# Altium footprint library robo.PcbLib: 14 footprints
Each footprint in its own frame and in the unit in brackets; x right, y up, seen from the top. Pads: shape width x height; smd on the part's side, far side on the other; paste and mask are expansions set on the pad; w line width, h text height; cw(c..) or ccw(c..) is an arc to the next point about the centre after c.
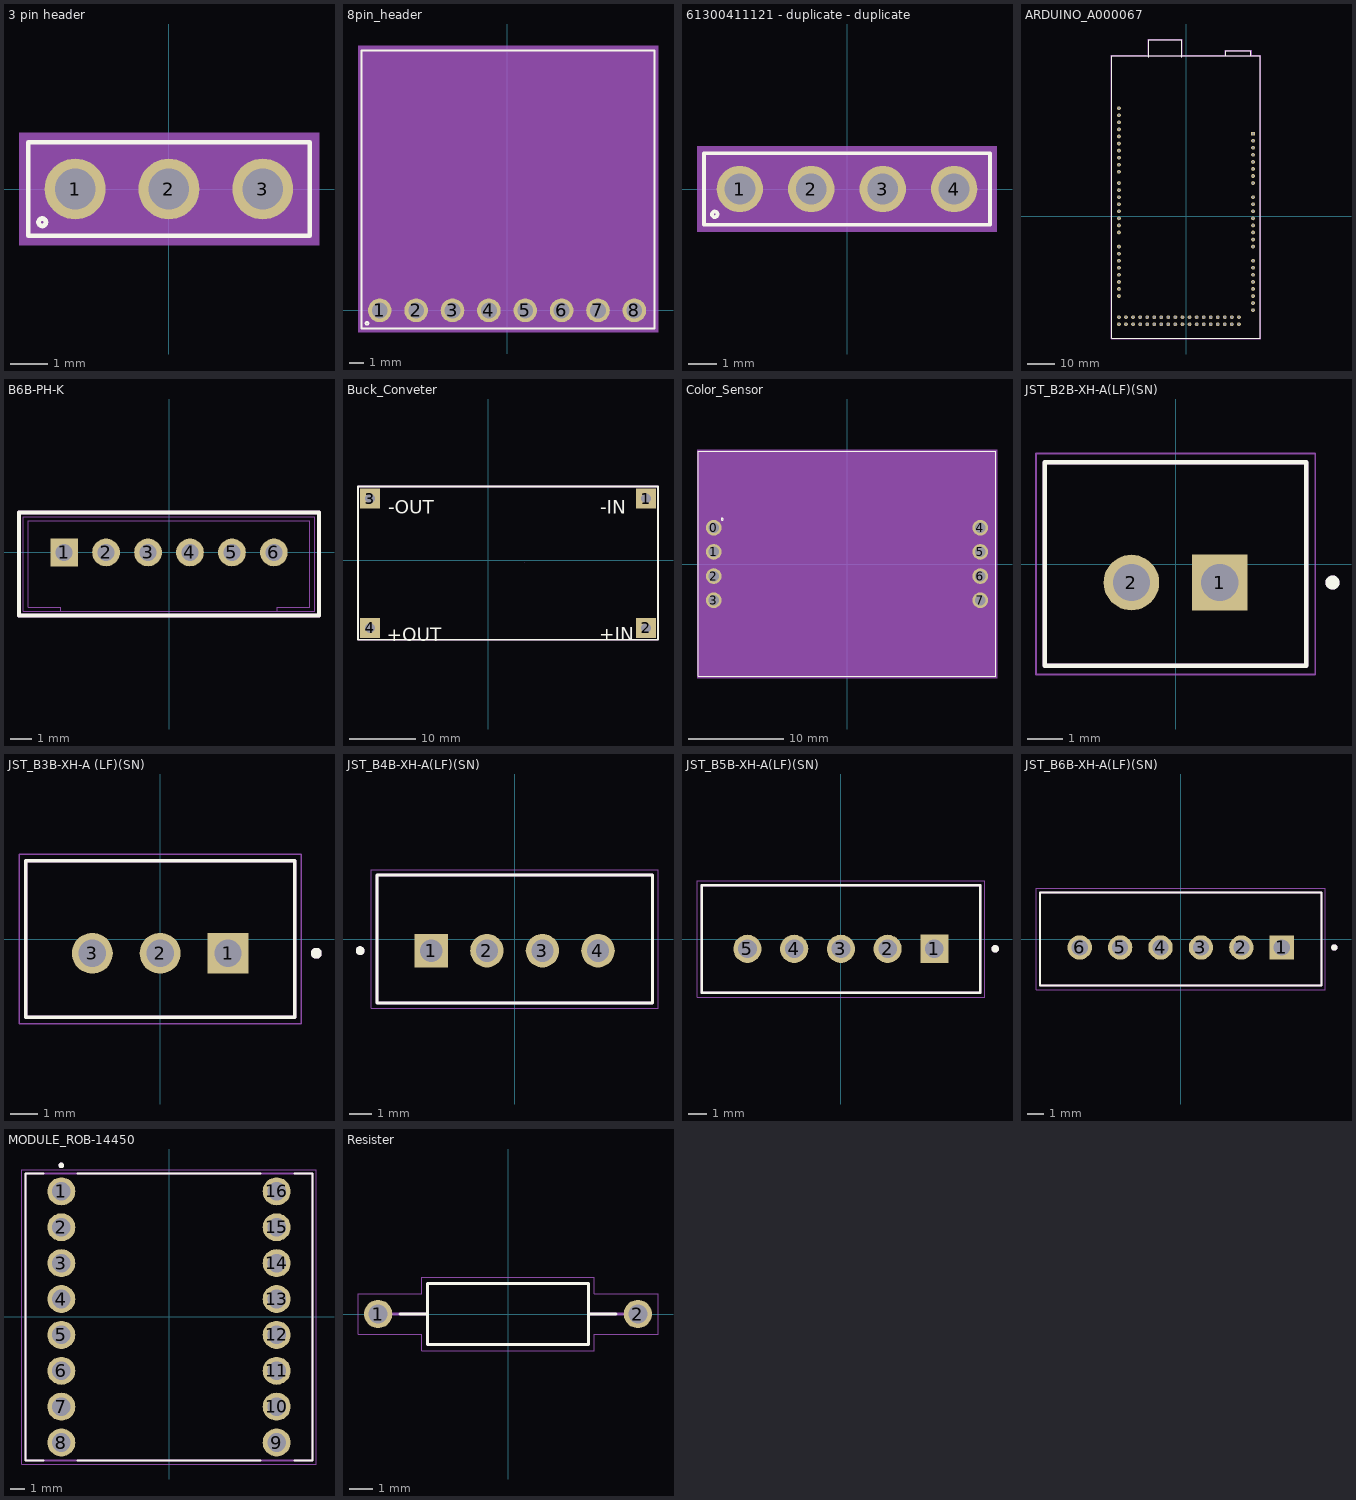
[diagram p0: the footprints below, top view; thin cyan lines are the x and y axes]

## 3 pin header [mm]
pads (3):
  round 1.65 hole 1.1: 1(-2.54,0) 2(0,0) 3(2.54,0)
Top Overlay:
  circle w0.127: c-3.43,-0.9 r0.1
  lines w0.127: -3.81,-1.27 -3.81,1.27 3.81,1.27 3.81,0.635 3.81,-0.635 3.81,-1.27 -3.81,-1.27
Top Assembly:
  circle w0.127: c-3.43,-0.9 r0.1
  lines w0.127: -3.81,-1.27 -3.81,1.27 3.81,1.27 3.81,-1.27 -3.81,-1.27
  text ".Designator" at -6.35,-0.508 h1.52
Mechanical 15:
  region: 4.064,-1.52 -4.06,-1.52 -4.06,1.52 4.064,1.52

## 8pin_header [mm]
pads (8):
  round 1.65 hole 1.1: 1(-8.89,0) 2(-6.35,0) 3(-3.81,0) 4(-1.27,0) 5(1.27,0) 6(3.81,0) 7(6.35,0) 8(8.89,0)
Top Overlay:
  circle w0.127: c-9.78,-0.9 r0.1
  circle w0.127: c-9.78,-0.9 r0.1
  lines w0.127: 10.287,-1.27 10.287,-0.762 ; 10.287,-1.27 10.287,-0.762 ; 10.287,-1.27 10.287,-0.762 ; 10.287,-1.27 0,-1.27 -10.16,-1.27 -10.16,18.161 10.287,18.161 10.287,-0.762
Top Assembly:
  circle w0.127: c-9.78,-0.9 r0.1
  circle w0.127: c-9.78,-0.9 r0.1
  lines w0.127: 10.287,-1.27 10.287,-0.762 ; 10.287,-1.27 10.287,-0.762 ; 10.287,-1.27 10.287,-0.762 ; 10.287,-1.27 0,-1.27 -10.16,-1.27 -10.16,18.161 10.287,18.161 10.287,-0.762
  text ".Designator" at -8.382,6.731 h1.52
Mechanical 15:
  region: 10.541,-1.52 -10.41,-1.52 -10.41,18.48 10.541,18.48
3D body "MPU6050 v2.step": height 1, standoff -1, extent -10.102,-1.176 10.16,14.384

## 61300411121 - duplicate - duplicate [mm]
pads (4):
  round 1.65 hole 1.1: 1(-3.81,0) 2(-1.27,0) 3(1.27,0) 4(3.81,0)
Top Overlay:
  circle w0.127: c-4.7,-0.9 r0.1
  lines w0.127: -5.08,-1.27 -5.08,1.27 5.08,1.27 5.08,-1.27 -5.08,-1.27
Top Assembly:
  circle w0.127: c-4.7,-0.9 r0.1
  lines w0.127: -5.08,-1.27 -5.08,1.27 5.08,1.27 5.08,-1.27 -5.08,-1.27
  text ".Designator" at -7.62,-0.508 h1.52
Mechanical 15:
  region: 5.33,-1.52 -5.33,-1.52 -5.33,1.52 5.33,1.52

## ARDUINO_A000067 [mil]
pads (86):
  round 53.46 hole 33.46: 0(-950,-230) 1(-950,-130) 2(-950,-30) 3(-950,70) 3V3(950,870) 4(-950,170) 5(-950,270) 5V_1(950,770) 5V_2(-950,-1530) 5V_3(-950,-1430) 6(-950,370) 7(-950,470) 8(-950,630) 9(-950,730) 10(-950,830) 11(-950,930) 12(-950,1030) 13(-950,1130) 14(-950,-430) 15(-950,-530) 16(-950,-630) 17(-950,-730) 18(-950,-830) 19(-950,-930) 20(-950,-1030) 21(-950,-1130) 22(-850,-1530) 23(-850,-1430) 24(-750,-1530) 25(-750,-1430) 26(-650,-1530) 27(-650,-1430) 28(-550,-1530) 29(-550,-1430) 30(-450,-1530) 31(-450,-1430) 32(-350,-1530) 33(-350,-1430) 34(-250,-1530) 35(-250,-1430) 36(-150,-1530) 37(-150,-1430) 38(-50,-1530) 39(-50,-1430) 40(50,-1530) 41(50,-1430) 42(150,-1530) 43(150,-1430) 44(250,-1530) 45(250,-1430) 46(350,-1530) 47(350,-1430) 48(450,-1530) 49(450,-1430) 50(550,-1530) 51(550,-1430) 52(650,-1530) 53(650,-1430) AD0(950,270) AD1(950,170) AD2(950,70) AD3(950,-30) AD4(950,-130) AD5(950,-230) AD6(950,-330) AD7(950,-430) AD8(950,-630) AD9(950,-730) AD10(950,-830) AD11(950,-930) AD12(950,-1030) AD13(950,-1130) AD14(950,-1230) AD15(950,-1330) AREF(-950,1330) GND1(950,670) GND2(950,570) GND3(-950,1230) GND4(750,-1530) GND5(750,-1430) IOREF(950,1070) RESET(950,970) SCL(-950,1530) SDA(-950,1430) VIN(950,470)
  rect 53.46x53.46 / inner round 53.46 / far side rect 53.46x53.46 hole 33.46: NC(950,1170)
Top Overlay:
  lines w5: -526.97,2251 -526.97,2501 -62.4,2501 -62.4,2251 ; 566.06,2271 920.08,2271 ; 566.06,2271 -87.4,2271 -551.97,2271 -1050,2271 -1050,-1729 1050,-1729 1050,2271 920.08,2271 ; 566.06,2271 566.06,2342.26 920.08,2342.26 920.08,2271
Top Assembly:
  lines w5: -526.97,2251 -526.97,2501 -62.4,2501 -62.4,2251 ; 566.06,2271 920.08,2271 ; 566.06,2271 -87.4,2271 -551.97,2271 -1050,2271 -1050,-1729 1050,-1729 1050,2271 920.08,2271 ; 566.06,2271 566.06,2342.26 920.08,2342.26 920.08,2271
  text ".Designator" at -285,274.99 h60
Mechanical 13:
  lines w5: -526.97,2251 -526.97,2501 -62.4,2501 -62.4,2251 ; 566.06,2271 920.08,2271 ; 566.06,2271 -87.4,2271 -551.97,2271 -1050,2271 -1050,-1729 1050,-1729 1050,2271 920.08,2271 ; 566.06,2271 566.06,2342.26 920.08,2342.26 920.08,2271
Mechanical 15:
  lines w1.97: -561.81,2280.84 -1059.84,2280.84 -1059.84,-1738.84 1059.84,-1738.84 1059.84,2280.84 929.92,2280.84 929.92,2352.1 556.22,2352.1 556.22,2280.84 -77.56,2280.84 ; -536.81,2260.84 -536.81,2510.84 -52.56,2510.84 -52.56,2260.84
3D body "step_temp.STEP": height 118.11, standoff -520.87, extent -1043.31,-1737.87 1043.31,2514.1

## B6B-PH-K [mil]
pads (6):
  rect 52x52 / inner round 52 / far side rect 52x52 hole 32: 1(-196.85,0)
  round 52 hole 32: 2(-118.11,0) 3(-39.37,0) 4(39.37,0) 5(118.11,0) 6(196.85,0)
Top Overlay:
  lines w8: -281.5,-118.11 281.5,-118.11 281.5,74.8 -281.5,74.8 -281.5,-118.11
Top Assembly:
  lines w8: -281.5,-118.11 281.5,-118.11 281.5,74.8 -281.5,74.8 -281.5,-118.11
  text ".Designator" at -290,-95.01 h60
Mechanical 13:
  lines w2: -202.76,-110.24 202.76,-110.24 ; -202.76,-110.24 -273.62,-110.24 -273.62,66.93 273.62,66.93 273.62,-110.24 202.76,-110.24 ; -202.76,-110.24 -202.76,-102.36 -263.78,-102.36 -263.78,59.06 263.78,59.06 263.78,-102.36 202.76,-102.36 202.76,-110.24
3D body "step_temp.STEP": height 236.22, standoff -134.7, extent -273.62,-110.24 273.62,66.93

## Buck_Conveter [mm]
pads (4):
  rect 3x3 hole 1.5 paste+0.102 mask+0.102: 1(23.642,9.249) 2(23.642,-10.151) 3(-17.758,9.249) 4(-17.758,-10.151)
Top Overlay:
  lines w0.254: -19.558,-11.951 -19.558,11.049 25.442,11.049 25.442,-11.951 -19.558,-11.951
  text "+OUT" at -15.24,-12.192 h2.03
  text "-OUT" at -14.986,6.985 h2.03
  text "+IN" at 16.637,-12.065 h2.03
  text "-IN" at 16.764,6.985 h2.03
Top Assembly:
  lines w0.254: -19.558,-11.951 -19.558,11.049 25.442,11.049 25.442,-11.951 -19.558,-11.951
  text "+OUT" at -15.24,-12.192 h2.03
  text "-OUT" at -14.986,6.985 h2.03
  text "+IN" at 16.637,-12.065 h2.03
  text "-IN" at 16.764,6.985 h2.03
  text ".Designator" at -5.715,2.54 h1.52
Mechanical 15:
  lines w0.003: 5.482,-0.381 5.482,-0.381
3D body "LM2596_DC-DC_BUCK CONVERTER ASSY-corrected 061823.STEP": height 5.09, standoff -8.72, extent -17.907,-9.906 25.273,11.201

## Color_Sensor [mm]
pads (8):
  round 1.65 hole 1.1: 0(-14,3.81) 1(-14,1.27) 2(-14,-1.27) 3(-14,-3.81) 4(14,3.81) 5(14,1.27) 6(14,-1.27) 7(14,-3.81)
Top Overlay:
  circle w0.127: c-13.1,4.725 r0.1
  circle w0.127: c-13.1,4.7 r0.1
  lines w0.127: 7.733,-11.811 7.733,-11.811 ; 7.733,-11.811 -8.11,-11.811 -15.621,-11.811 -15.621,11.836 15.596,11.836 15.604,11.828 15.604,-1.968 15.604,-3.619 15.604,-5.524 15.604,-6.413 15.604,-7.683 15.604,-8.319 15.604,-9.271 15.604,-11.811 7.733,-11.811 ; 7.733,-11.786 7.733,-11.786 ; 7.733,-11.786 -8.11,-11.786 -15.621,-11.786 -15.621,11.862 15.596,11.862 15.604,11.853 15.604,-1.943 15.604,-3.594 15.604,-5.499 15.604,-6.388 15.604,-7.658 15.604,-8.293 15.604,-9.246 15.604,-11.786 7.733,-11.786
Top Assembly:
  circle w0.127: c-13.1,4.751 r0.1
  circle w0.127: c-13.1,4.725 r0.1
  lines w0.127: 7.733,-11.786 7.733,-11.786 ; 7.733,-11.786 -8.11,-11.786 -15.621,-11.786 -15.621,11.862 15.596,11.862 15.604,11.853 15.604,-1.943 15.604,-3.594 15.604,-5.499 15.604,-6.388 15.604,-7.658 15.604,-8.293 15.604,-9.246 15.604,-11.786 7.733,-11.786 ; 7.733,-11.76 7.733,-11.76 ; 7.733,-11.76 -8.11,-11.76 -15.621,-11.76 -15.621,11.887 15.596,11.887 15.604,11.879 15.604,-1.918 15.604,-3.569 15.604,-5.474 15.604,-6.363 15.604,-7.633 15.604,-8.268 15.604,-9.22 15.604,-11.76 7.733,-11.76
  text ".Designator" at -7.366,2.286 h1.52
Mechanical 15:
  region: 15.75,-12 15.75,12 -15.75,12 -15.75,-12

## JST_B2B-XH-A(LF)(SN) [mm]
height 7
pads (2):
  rect 1.575x1.575 / inner round 1.575 / far side rect 1.575x1.575 hole 1.05: 1(1.25,-0.525)
  round 1.575 hole 1.05: 2(-1.25,-0.525)
Top Overlay:
  circle w0.2: c4.44,-0.525 r0.1
  lines w0.127: -3.7,-2.875 3.7,-2.875 3.7,2.875 -3.7,2.875 -3.7,-2.875
Mechanical 13:
  circle w0.2: c4.44,-0.525 r0.1
  lines w0.127: -3.7,-2.875 3.7,-2.875 3.7,2.875 -3.7,2.875 -3.7,-2.875
Mechanical 15:
  lines w0.05: -3.95,-3.125 -3.95,3.125 3.95,3.125 3.95,-3.125 -3.95,-3.125
3D body "step_temp.STEP": height 7, standoff -3.4, extent -3.7,-2.875 3.7,2.875

## JST_B3B-XH-A (LF)(SN) [mm]
height 7
pads (3):
  rect 1.508x1.508 / inner round 1.508 / far side rect 1.508x1.508 hole 1: 1(2.5,-0.525)
  round 1.508 hole 1: 2(0,-0.525) 3(-2.5,-0.525)
Top Overlay:
  circle w0.2: c5.75,-0.525 r0.1
  lines w0.127: -4.95,-2.875 -4.95,2.875 4.95,2.875 4.95,-2.875 -4.95,-2.875
Mechanical 13:
  circle w0.2: c5.75,-0.525 r0.1
  lines w0.127: -4.95,-2.875 -4.95,2.875 4.95,2.875 4.95,-2.875 -4.95,-2.875
Mechanical 15:
  lines w0.05: -5.2,-3.125 -5.2,3.125 5.2,3.125 5.2,-3.125 -5.2,-3.125
3D body "step_temp.STEP": height 7, standoff -3.4, extent -4.95,-2.875 4.95,2.875

## JST_B4B-XH-A(LF)(SN) [mm]
height 7
pads (4):
  rect 1.508x1.508 / inner round 1.508 / far side rect 1.508x1.508 hole 1: 1(-3.75,-0.525)
  round 1.508 hole 1: 2(-1.25,-0.525) 3(1.25,-0.525) 4(3.75,-0.525)
Top Overlay:
  circle w0.2: c-6.95,-0.525 r0.1
  lines w0.127: -6.2,-2.875 -6.2,2.875 6.2,2.875 6.2,-2.875 -6.2,-2.875
Top Assembly:
  circle w0.2: c-6.95,-0.525 r0.1
  lines w0.127: -6.2,-2.875 -6.2,2.875 6.2,2.875 6.2,-2.875 -6.2,-2.875
  text ".Designator" at -7.493,0.889 h1.52
Mechanical 13:
  circle w0.2: c-6.95,-0.525 r0.1
  lines w0.127: -6.2,-2.875 -6.2,2.875 6.2,2.875 6.2,-2.875 -6.2,-2.875
Mechanical 15:
  lines w0.05: -6.45,-3.125 6.45,-3.125 6.45,3.125 -6.45,3.125 -6.45,-3.125
3D body "step_temp.STEP": height 7, standoff -3.4, extent -6.2,-2.875 6.2,2.875

## JST_B5B-XH-A(LF)(SN) [mm]
height 7
pads (5):
  rect 1.508x1.508 / inner round 1.508 / far side rect 1.508x1.508 hole 1: 1(5,-0.525)
  round 1.508 hole 1: 2(2.5,-0.525) 3(0,-0.525) 4(-2.5,-0.525) 5(-5,-0.525)
Top Overlay:
  circle w0.2: c8.25,-0.525 r0.1
  lines w0.127: -7.45,-2.875 -7.45,2.875 7.45,2.875 7.45,-2.875 -7.45,-2.875
Mechanical 13:
  circle w0.2: c8.25,-0.525 r0.1
  lines w0.127: -7.45,-2.875 -7.45,2.875 7.45,2.875 7.45,-2.875 -7.45,-2.875
Mechanical 15:
  lines w0.05: -7.7,-3.125 -7.7,3.125 7.7,3.125 7.7,-3.125 -7.7,-3.125
3D body "step_temp.STEP": height 7, standoff -3.4, extent -7.45,-2.875 7.45,2.875

## JST_B6B-XH-A(LF)(SN) [mm]
height 7
pads (6):
  rect 1.508x1.508 / inner round 1.508 / far side rect 1.508x1.508 hole 1: 1(6.25,-0.525)
  round 1.508 hole 1: 2(3.75,-0.525) 3(1.25,-0.525) 4(-1.25,-0.525) 5(-3.75,-0.525) 6(-6.25,-0.525)
Top Overlay:
  circle w0.2: c9.5,-0.525 r0.1
  lines w0.127: -8.7,-2.875 8.7,-2.875 8.7,2.875 -8.7,2.875 -8.7,-2.875
Mechanical 13:
  circle w0.2: c9.5,-0.525 r0.1
  lines w0.127: -8.7,-2.875 8.7,-2.875 8.7,2.875 -8.7,2.875 -8.7,-2.875
Mechanical 15:
  lines w0.05: -8.95,-3.125 8.95,-3.125 8.95,3.125 -8.95,3.125 -8.95,-3.125
3D body "step_temp.STEP": height 7, standoff -3.4, extent -8.7,-2.875 8.7,2.875

## MODULE_ROB-14450 [mm]
pads (16):
  round 1.98 hole 1.32: 1(-7.62,8.89) 2(-7.62,6.35) 3(-7.62,3.81) 4(-7.62,1.27) 5(-7.62,-1.27) 6(-7.62,-3.81) 7(-7.62,-6.35) 8(-7.62,-8.89) 9(7.62,-8.89) 10(7.62,-6.35) 11(7.62,-3.81) 12(7.62,-1.27) 13(7.62,1.27) 14(7.62,3.81) 15(7.62,6.35) 16(7.62,8.89)
Top Overlay:
  circle w0.2: c-7.62,10.728 r0.1
  lines w0.127: -8.89,-10.16 -10.16,-10.16 -10.16,10.16 -8.89,10.16 ; -6.5,-10.16 6.5,-10.16 ; -6.5,10.16 6.5,10.16 ; 8.89,-10.16 10.16,-10.16 10.16,10.16 8.89,10.16
Mechanical 13:
  circle w0.2: c-7.62,10.728 r0.1
  lines w0.127: -10.16,-10.16 -10.16,10.16 10.16,10.16 10.16,-10.16 -10.16,-10.16
Mechanical 15:
  lines w0.05: -10.41,-10.41 -10.41,10.41 10.41,10.41 10.41,-10.41 -10.41,-10.41
3D body "step_temp.STEP": height 5.5, standoff -6, extent -10.16,-10.16 10.16,10.16

## Resister [mm]
pads (2):
  round 1.2 hole 0.8: 1(-5.5,0) 2(5.5,0)
Top Overlay:
  lines w0.127: -4.58,0 -3.4,0 ; 4.58,0 3.4,0 ; -3.4,0 -3.4,-1.3 3.4,-1.3 3.4,0 ; -3.4,0 -3.4,1.3 3.4,1.3 3.4,0
Top Assembly:
  lines w0.127: -4.58,0 -3.4,0 ; 4.58,0 3.4,0 ; -3.4,0 -3.4,-1.3 3.4,-1.3 3.4,0 ; -3.4,0 -3.4,1.3 3.4,1.3 3.4,0
  text ".Designator" at -7.62,-0.508 h1.52
Mechanical 13:
  lines w0.127: -4.9,0 -3.4,0 ; 4.9,0 3.4,0 ; -3.4,0 -3.4,-1.3 3.4,-1.3 3.4,0 ; -3.4,0 -3.4,1.3 3.4,1.3 3.4,0
Mechanical 15:
  lines w0.05: -6.35,-0.85 -6.35,0.85 -3.65,0.85 -3.65,1.55 3.65,1.55 3.65,0.85 6.35,0.85 6.35,-0.85 3.65,-0.85 3.65,-1.55 -3.65,-1.55 -3.65,-0.85 -6.35,-0.85
3D body "step_temp.STEP": height 2.6, standoff -25.53, extent -5.775,-1.3 5.775,1.3